# Altium schematic symbol library jlcpcb_2025_04_capacitors_extended_0805.schlib: 3281 symbols (part 11 of 18) (continued)
## CGA0805X5R476M100MT
designator C?  Capacitance: 47uF  (hidden comment: *)
Capacitor, Ceramic (MLCC), 47uF, ±20%, 10V, X5R, ±20%, SMD 0805; Manufacturer: HRE; Manufacturer Part Number: CGA0805X5R476M100MT; Package Size: 0805; JLCPCB Basic Part: No; JLCPCB Part Number: C6119904; Supplier 1: LCSC; Category: Capacitors - MLCC; Supplier Part Number 1: C6119904; Tolerance: ±20%; Voltage Rating: 10V; Temperature Coefficient: X5R; RoHS: Yes; ComponentLink1Description: Datasheet; ComponentLink2Description: JLCPCB Part URL; ComponentLink2URL: https://jlcpcb.com/partdetail/C6119904; ComponentLink3Description: LCSC Part URL; ComponentLink3URL: https://lcsc.com/product-detail/Multilayer-Ceramic-Capacitors-MLCC---SMD-SMT_HRE-HRE-CGA0805X5R476M100MT_C6119904.html
footprint CAP-0805 (0805 (2012M) Capacitor)
pins: 1, 2

## CGA0805X6S226M160MT
designator C?  Capacitance: 22uF  (hidden comment: *)
Capacitor, Ceramic (MLCC), 22uF, ±20%, 16V, X6S, ±20%, SMD 0805; Manufacturer: HRE; Manufacturer Part Number: CGA0805X6S226M160MT; Package Size: 0805; JLCPCB Basic Part: No; JLCPCB Part Number: C6119913; Supplier 1: LCSC; Category: Capacitors - MLCC; Supplier Part Number 1: C6119913; Tolerance: ±20%; Voltage Rating: 16V; Temperature Coefficient: X6S; RoHS: Yes; ComponentLink1Description: Datasheet; ComponentLink2Description: JLCPCB Part URL; ComponentLink2URL: https://jlcpcb.com/partdetail/C6119913; ComponentLink3Description: LCSC Part URL; ComponentLink3URL: https://lcsc.com/product-detail/Multilayer-Ceramic-Capacitors-MLCC---SMD-SMT_HRE-HRE-CGA0805X6S226M160MT_C6119913.html
footprint CAP-0805 (0805 (2012M) Capacitor)
pins: 1, 2

## CGA0805X6S476M6R3MT
designator C?  Capacitance: 47uF  (hidden comment: *)
Capacitor, Ceramic (MLCC), 47uF, ±20%, 6.3V, X6S, ±20%, SMD 0805; Manufacturer: HRE; Manufacturer Part Number: CGA0805X6S476M6R3MT; Package Size: 0805; JLCPCB Basic Part: No; JLCPCB Part Number: C6119922; Supplier 1: LCSC; Category: Capacitors - MLCC; Supplier Part Number 1: C6119922; Tolerance: ±20%; Voltage Rating: 6.3V; Temperature Coefficient: X6S; RoHS: Yes; ComponentLink1Description: Datasheet; ComponentLink2Description: JLCPCB Part URL; ComponentLink2URL: https://jlcpcb.com/partdetail/C6119922; ComponentLink3Description: LCSC Part URL; ComponentLink3URL: https://lcsc.com/product-detail/Multilayer-Ceramic-Capacitors-MLCC---SMD-SMT_HRE-HRE-CGA0805X6S476M6R3MT_C6119922.html
footprint CAP-0805 (0805 (2012M) Capacitor)
pins: 1, 2

## CGA0805X7R106K250MT
designator C?  Capacitance: 10uF  (hidden comment: *)
Capacitor, Ceramic (MLCC), 10uF, ±10%, 25V, X7R, ±10%, SMD 0805; Manufacturer: HRE; Manufacturer Part Number: CGA0805X7R106K250MT; Package Size: 0805; JLCPCB Basic Part: No; JLCPCB Part Number: C6119932; Supplier 1: LCSC; Category: Capacitors - MLCC; Supplier Part Number 1: C6119932; Tolerance: ±10%; Voltage Rating: 25V; Temperature Coefficient: X7R; RoHS: Yes; ComponentLink1Description: Datasheet; ComponentLink2Description: JLCPCB Part URL; ComponentLink2URL: https://jlcpcb.com/partdetail/C6119932; ComponentLink3Description: LCSC Part URL; ComponentLink3URL: https://lcsc.com/product-detail/Multilayer-Ceramic-Capacitors-MLCC---SMD-SMT_HRE-HRE-CGA0805X7R106K250MT_C6119932.html
footprint CAP-0805 (0805 (2012M) Capacitor)
pins: 1, 2

## CGA0805X7R225K101MT
designator C?  Capacitance: 2.2uF  (hidden comment: *)
Capacitor, Ceramic (MLCC), 2.2uF, ±10%, 100V, X7R, ±10%, SMD 0805; Manufacturer: HRE; Manufacturer Part Number: CGA0805X7R225K101MT; Package Size: 0805; JLCPCB Basic Part: No; JLCPCB Part Number: C6119935; Supplier 1: LCSC; Category: Capacitors - MLCC; Supplier Part Number 1: C6119935; Tolerance: ±10%; Voltage Rating: 100V; Temperature Coefficient: X7R; RoHS: Yes; ComponentLink1Description: Datasheet; ComponentLink1URL: https://wmsc.lcsc.com/wmsc/upload/file/pdf/v2/lcsc/2404291513_HRE-CGA0805X7R225K101MT_C6119935.pdf; ComponentLink2Description: JLCPCB Part URL; ComponentLink2URL: https://jlcpcb.com/partdetail/C6119935; ComponentLink3Description: LCSC Part URL; ComponentLink3URL: https://lcsc.com/product-detail/Multilayer-Ceramic-Capacitors-MLCC---SMD-SMT_HRE-HRE-CGA0805X7R225K101MT_C6119935.html
footprint CAP-0805 (0805 (2012M) Capacitor)
pins: 1, 2

## CGA0805X7R475K350MT
designator C?  Capacitance: 4.7uF  (hidden comment: *)
Capacitor, Ceramic (MLCC), 4.7uF, ±10%, 35V, X7R, ±10%, SMD 0805; Manufacturer: HRE; Manufacturer Part Number: CGA0805X7R475K350MT; Package Size: 0805; JLCPCB Basic Part: No; JLCPCB Part Number: C6119943; Supplier 1: LCSC; Category: Capacitors - MLCC; Supplier Part Number 1: C6119943; Tolerance: ±10%; Voltage Rating: 35V; Temperature Coefficient: X7R; RoHS: Yes; ComponentLink1Description: Datasheet; ComponentLink2Description: JLCPCB Part URL; ComponentLink2URL: https://jlcpcb.com/partdetail/C6119943; ComponentLink3Description: LCSC Part URL; ComponentLink3URL: https://lcsc.com/product-detail/Multilayer-Ceramic-Capacitors-MLCC---SMD-SMT_HRE-HRE-CGA0805X7R475K350MT_C6119943.html
footprint CAP-0805 (0805 (2012M) Capacitor)
pins: 1, 2

## CGJ4C2C0G2A101JT000N
designator C?  Capacitance: 100pF  (hidden comment: *)
Capacitor, Ceramic (MLCC), 100pF, ±5%, 100V, C0G, ±5%, SMD 0805; Manufacturer: TDK; Manufacturer Part Number: CGJ4C2C0G2A101JT000N; Package Size: 0805; JLCPCB Basic Part: No; JLCPCB Part Number: C508866; Supplier 1: LCSC; Category: Capacitors - MLCC; Supplier Part Number 1: C508866; Tolerance: ±5%; Voltage Rating: 100V; Temperature Coefficient: C0G; RoHS: Yes; ComponentLink1Description: Datasheet; ComponentLink1URL: https://wmsc.lcsc.com/wmsc/upload/file/pdf/v2/lcsc/2004071033_TDK-CGJ4C2C0G2A101JT000N_C508866.pdf; ComponentLink2Description: JLCPCB Part URL; ComponentLink2URL: https://jlcpcb.com/partdetail/C508866; ComponentLink3Description: LCSC Part URL; ComponentLink3URL: https://lcsc.com/product-detail/Multilayer-Ceramic-Capacitors-MLCC---SMD-SMT_TDK-TDK-CGJ4C2C0G2A101JT000N_C508866.html
footprint CAP-0805 (0805 (2012M) Capacitor)
pins: 1, 2

## CL21A105KACLNNC
designator C?  Capacitance: 1uF  (hidden comment: *)
Capacitor, Ceramic (MLCC), 1uF, ±10%, 25V, X5R, ±10%, SMD 0805; Manufacturer: Samsung Electro-Mechanics; Manufacturer Part Number: CL21A105KACLNNC; Package Size: 0805; JLCPCB Basic Part: No; JLCPCB Part Number: C2932475; Supplier 1: LCSC; Category: Capacitors - MLCC; Supplier Part Number 1: C2932475; Tolerance: ±10%; Voltage Rating: 25V; Temperature Coefficient: X5R; RoHS: Yes; ComponentLink1Description: Datasheet; ComponentLink1URL: https://wmsc.lcsc.com/wmsc/upload/file/pdf/v2/lcsc/2201121530_Samsung-Electro-Mechanics-CL21A105KACLNNC_C2932475.pdf; ComponentLink2Description: JLCPCB Part URL; ComponentLink2URL: https://jlcpcb.com/partdetail/C2932475; ComponentLink3Description: LCSC Part URL; ComponentLink3URL: https://lcsc.com/product-detail/Multilayer-Ceramic-Capacitors-MLCC---SMD-SMT_Samsung-Electro-Mechanics-Samsung-Electro-Mechanics-CL21A105KACLNNC_C2932475.html; ComponentLink4Description: Samsung Component Library; ComponentLink4URL: https://weblib.samsungsem.com/mlcc/mlcc-ec.do?partNumber=CL21A105KACLNN
footprint CAP-0805 (0805 (2012M) Capacitor)
pins: 1, 2

## CL21A105KBCLNNC
designator C?  Capacitance: 1uF  (hidden comment: *)
Capacitor, Ceramic (MLCC), 1uF, ±10%, 50V, X5R, ±10%, SMD 0805; Manufacturer: Samsung Electro-Mechanics; Manufacturer Part Number: CL21A105KBCLNNC; Package Size: 0805; JLCPCB Basic Part: No; JLCPCB Part Number: C318694; Supplier 1: LCSC; Category: Capacitors - MLCC; Supplier Part Number 1: C318694; Tolerance: ±10%; Voltage Rating: 50V; Temperature Coefficient: X5R; RoHS: Yes; ComponentLink1Description: Datasheet; ComponentLink1URL: https://wmsc.lcsc.com/wmsc/upload/file/pdf/v2/lcsc/2304140030_Samsung-Electro-Mechanics-CL21A105KBCLNNC_C318694.pdf; ComponentLink2Description: JLCPCB Part URL; ComponentLink2URL: https://jlcpcb.com/partdetail/C318694; ComponentLink3Description: LCSC Part URL; ComponentLink3URL: https://lcsc.com/product-detail/Multilayer-Ceramic-Capacitors-MLCC---SMD-SMT_Samsung-Electro-Mechanics-Samsung-Electro-Mechanics-CL21A105KBCLNNC_C318694.html; ComponentLink4Description: Samsung Component Library; ComponentLink4URL: https://weblib.samsungsem.com/mlcc/mlcc-ec.do?partNumber=CL21A105KBCLNN
footprint CAP-0805 (0805 (2012M) Capacitor)
pins: 1, 2

## CL21A106KACLRNC
designator C?  Capacitance: 10uF  (hidden comment: *)
Capacitor, Ceramic (MLCC), 10uF, ±10%, 25V, X5R, ±10%, SMD 0805; Manufacturer: Samsung Electro-Mechanics; Manufacturer Part Number: CL21A106KACLRNC; Package Size: 0805; JLCPCB Basic Part: No; JLCPCB Part Number: C318687; Supplier 1: LCSC; Category: Capacitors - MLCC; Supplier Part Number 1: C318687; Tolerance: ±10%; Voltage Rating: 25V; Temperature Coefficient: X5R; RoHS: Yes; ComponentLink1Description: Datasheet; ComponentLink1URL: https://wmsc.lcsc.com/wmsc/upload/file/pdf/v2/lcsc/2304140030_Samsung-Electro-Mechanics-CL21A106KACLRNC_C318687.pdf; ComponentLink2Description: JLCPCB Part URL; ComponentLink2URL: https://jlcpcb.com/partdetail/C318687; ComponentLink3Description: LCSC Part URL; ComponentLink3URL: https://lcsc.com/product-detail/Multilayer-Ceramic-Capacitors-MLCC---SMD-SMT_Samsung-Electro-Mechanics-Samsung-Electro-Mechanics-CL21A106KACLRNC_C318687.html; ComponentLink4Description: Samsung Component Library; ComponentLink4URL: https://weblib.samsungsem.com/mlcc/mlcc-ec.do?partNumber=CL21A106KACLRN
footprint CAP-0805 (0805 (2012M) Capacitor)
pins: 1, 2

## CL21A106KBYQNNE
designator C?  Capacitance: 10uF  (hidden comment: *)
Capacitor, Ceramic (MLCC), 10uF, ±10%, 50V, X5R, ±10%, SMD 0805; Manufacturer: Samsung Electro-Mechanics; Manufacturer Part Number: CL21A106KBYQNNE; Package Size: 0805; JLCPCB Basic Part: No; JLCPCB Part Number: C2932476; Supplier 1: LCSC; Category: Capacitors - MLCC; Supplier Part Number 1: C2932476; Tolerance: ±10%; Voltage Rating: 50V; Temperature Coefficient: X5R; RoHS: Yes; ComponentLink1Description: Datasheet; ComponentLink1URL: https://wmsc.lcsc.com/wmsc/upload/file/pdf/v2/lcsc/2201121530_Samsung-Electro-Mechanics-CL21A106KBYQNNE_C2932476.pdf; ComponentLink2Description: JLCPCB Part URL; ComponentLink2URL: https://jlcpcb.com/partdetail/C2932476; ComponentLink3Description: LCSC Part URL; ComponentLink3URL: https://lcsc.com/product-detail/Multilayer-Ceramic-Capacitors-MLCC---SMD-SMT_Samsung-Electro-Mechanics-Samsung-Electro-Mechanics-CL21A106KBYQNNE_C2932476.html; ComponentLink4Description: Samsung Component Library; ComponentLink4URL: https://weblib.samsungsem.com/mlcc/mlcc-ec.do?partNumber=CL21A106KBYQNN
footprint CAP-0805 (0805 (2012M) Capacitor)
pins: 1, 2

## CL21A106KOCLRNC
designator C?  Capacitance: 10uF  (hidden comment: *)
Capacitor, Ceramic (MLCC), 10uF, ±10%, 16V, X5R, ±10%, SMD 0805; Manufacturer: Samsung Electro-Mechanics; Manufacturer Part Number: CL21A106KOCLRNC; Package Size: 0805; JLCPCB Basic Part: No; JLCPCB Part Number: C318695; Supplier 1: LCSC; Category: Capacitors - MLCC; Supplier Part Number 1: C318695; Tolerance: ±10%; Voltage Rating: 16V; Temperature Coefficient: X5R; RoHS: Yes; ComponentLink1Description: Datasheet; ComponentLink1URL: https://wmsc.lcsc.com/wmsc/upload/file/pdf/v2/lcsc/2304140030_Samsung-Electro-Mechanics-CL21A106KOCLRNC_C318695.pdf; ComponentLink2Description: JLCPCB Part URL; ComponentLink2URL: https://jlcpcb.com/partdetail/C318695; ComponentLink3Description: LCSC Part URL; ComponentLink3URL: https://lcsc.com/product-detail/Multilayer-Ceramic-Capacitors-MLCC---SMD-SMT_Samsung-Electro-Mechanics-Samsung-Electro-Mechanics-CL21A106KOCLRNC_C318695.html; ComponentLink4Description: Samsung Component Library; ComponentLink4URL: https://weblib.samsungsem.com/mlcc/mlcc-ec.do?partNumber=CL21A106KOCLRN
footprint CAP-0805 (0805 (2012M) Capacitor)
pins: 1, 2

## CL21A106KOFNNNE
designator C?  Capacitance: 10uF  (hidden comment: *)
Capacitor, Ceramic (MLCC), 10uF, ±10%, 16V, X5R, ±10%, SMD 0805; Manufacturer: Samsung Electro-Mechanics; Manufacturer Part Number: CL21A106KOFNNNE; Package Size: 0805; JLCPCB Basic Part: No; JLCPCB Part Number: C307518; Supplier 1: LCSC; Category: Capacitors - MLCC; Supplier Part Number 1: C307518; Tolerance: ±10%; Voltage Rating: 16V; Temperature Coefficient: X5R; RoHS: Yes; ComponentLink1Description: Datasheet; ComponentLink1URL: https://wmsc.lcsc.com/wmsc/upload/file/pdf/v2/lcsc/2304140030_Samsung-Electro-Mechanics-CL21A106KOFNNNE_C307518.pdf; ComponentLink2Description: JLCPCB Part URL; ComponentLink2URL: https://jlcpcb.com/partdetail/C307518; ComponentLink3Description: LCSC Part URL; ComponentLink3URL: https://lcsc.com/product-detail/Multilayer-Ceramic-Capacitors-MLCC---SMD-SMT_Samsung-Electro-Mechanics-Samsung-Electro-Mechanics-CL21A106KOFNNNE_C307518.html; ComponentLink4Description: Samsung Component Library; ComponentLink4URL: https://weblib.samsungsem.com/mlcc/mlcc-ec.do?partNumber=CL21A106KOFNNN
footprint CAP-0805 (0805 (2012M) Capacitor)
pins: 1, 2

## CL21A106KOQNNNE
designator C?  Capacitance: 10uF  (hidden comment: *)
Capacitor, Ceramic (MLCC), 10uF, ±10%, 16V, X5R, ±10%, SMD 0805; Manufacturer: Samsung Electro-Mechanics; Manufacturer Part Number: CL21A106KOQNNNE; Package Size: 0805; JLCPCB Basic Part: No; JLCPCB Part Number: C1713; Supplier 1: LCSC; Category: Capacitors - MLCC; Supplier Part Number 1: C1713; Tolerance: ±10%; Voltage Rating: 16V; Temperature Coefficient: X5R; RoHS: Yes; ComponentLink1Description: Datasheet; ComponentLink1URL: https://wmsc.lcsc.com/wmsc/upload/file/pdf/v2/lcsc/2304140030_Samsung-Electro-Mechanics-CL21A106KOQNNNE_C1713.pdf; ComponentLink2Description: JLCPCB Part URL; ComponentLink2URL: https://jlcpcb.com/partdetail/C1713; ComponentLink3Description: LCSC Part URL; ComponentLink3URL: https://lcsc.com/product-detail/Multilayer-Ceramic-Capacitors-MLCC---SMD-SMT_Samsung-Electro-Mechanics-Samsung-Electro-Mechanics-CL21A106KOQNNNE_C1713.html; ComponentLink4Description: Samsung Component Library; ComponentLink4URL: https://weblib.samsungsem.com/mlcc/mlcc-ec.do?partNumber=CL21A106KOQNNN
footprint CAP-0805 (0805 (2012M) Capacitor)
pins: 1, 2

## CL21A106KOQNNNG
designator C?  Capacitance: 10uF  (hidden comment: *)
Capacitor, Ceramic (MLCC), 10uF, ±10%, 16V, X5R, ±10%, SMD 0805; Manufacturer: Samsung Electro-Mechanics; Manufacturer Part Number: CL21A106KOQNNNG; Package Size: 0805; JLCPCB Basic Part: No; JLCPCB Part Number: C307520; Supplier 1: LCSC; Category: Capacitors - MLCC; Supplier Part Number 1: C307520; Tolerance: ±10%; Voltage Rating: 16V; Temperature Coefficient: X5R; RoHS: Yes; ComponentLink1Description: Datasheet; ComponentLink1URL: https://wmsc.lcsc.com/wmsc/upload/file/pdf/v2/lcsc/2304140030_Samsung-Electro-Mechanics-CL21A106KOQNNNG_C307520.pdf; ComponentLink2Description: JLCPCB Part URL; ComponentLink2URL: https://jlcpcb.com/partdetail/C307520; ComponentLink3Description: LCSC Part URL; ComponentLink3URL: https://lcsc.com/product-detail/Multilayer-Ceramic-Capacitors-MLCC---SMD-SMT_Samsung-Electro-Mechanics-Samsung-Electro-Mechanics-CL21A106KOQNNNG_C307520.html; ComponentLink4Description: Samsung Component Library; ComponentLink4URL: https://weblib.samsungsem.com/mlcc/mlcc-ec.do?partNumber=CL21A106KOQNNN
footprint CAP-0805 (0805 (2012M) Capacitor)
pins: 1, 2

## CL21A106KPCLQNC
designator C?  Capacitance: 10uF  (hidden comment: *)
Capacitor, Ceramic (MLCC), 10uF, ±10%, 10V, X5R, ±10%, SMD 0805; Manufacturer: Samsung Electro-Mechanics; Manufacturer Part Number: CL21A106KPCLQNC; Package Size: 0805; JLCPCB Basic Part: No; JLCPCB Part Number: C962097; Supplier 1: LCSC; Category: Capacitors - MLCC; Supplier Part Number 1: C962097; Tolerance: ±10%; Voltage Rating: 10V; Temperature Coefficient: X5R; RoHS: Yes; ComponentLink1Description: Datasheet; ComponentLink1URL: https://wmsc.lcsc.com/wmsc/upload/file/pdf/v2/lcsc/2304140030_Samsung-Electro-Mechanics-CL21A106KPCLQNC_C962097.pdf; ComponentLink2Description: JLCPCB Part URL; ComponentLink2URL: https://jlcpcb.com/partdetail/C962097; ComponentLink3Description: LCSC Part URL; ComponentLink3URL: https://lcsc.com/product-detail/Multilayer-Ceramic-Capacitors-MLCC---SMD-SMT_Samsung-Electro-Mechanics-Samsung-Electro-Mechanics-CL21A106KPCLQNC_C962097.html; ComponentLink4Description: Samsung Component Library; ComponentLink4URL: https://weblib.samsungsem.com/mlcc/mlcc-ec.do?partNumber=CL21A106KPCLQN
footprint CAP-0805 (0805 (2012M) Capacitor)
pins: 1, 2

## CL21A106KPFNNNE
designator C?  Capacitance: 10uF  (hidden comment: *)
Capacitor, Ceramic (MLCC), 10uF, ±10%, 10V, X5R, ±10%, SMD 0805; Manufacturer: Samsung Electro-Mechanics; Manufacturer Part Number: CL21A106KPFNNNE; Package Size: 0805; JLCPCB Basic Part: No; JLCPCB Part Number: C17024; Supplier 1: LCSC; Category: Capacitors - MLCC; Supplier Part Number 1: C17024; Tolerance: ±10%; Voltage Rating: 10V; Temperature Coefficient: X5R; RoHS: Yes; ComponentLink1Description: Datasheet; ComponentLink1URL: https://wmsc.lcsc.com/wmsc/upload/file/pdf/v2/lcsc/2304140030_Samsung-Electro-Mechanics-CL21A106KPFNNNE_C17024.pdf; ComponentLink2Description: JLCPCB Part URL; ComponentLink2URL: https://jlcpcb.com/partdetail/C17024; ComponentLink3Description: LCSC Part URL; ComponentLink3URL: https://lcsc.com/product-detail/Multilayer-Ceramic-Capacitors-MLCC---SMD-SMT_Samsung-Electro-Mechanics-Samsung-Electro-Mechanics-CL21A106KPFNNNE_C17024.html; ComponentLink4Description: Samsung Component Library; ComponentLink4URL: https://weblib.samsungsem.com/mlcc/mlcc-ec.do?partNumber=CL21A106KPFNNN
footprint CAP-0805 (0805 (2012M) Capacitor)
pins: 1, 2

## CL21A106KPFNNNF
designator C?  Capacitance: 10uF  (hidden comment: *)
Capacitor, Ceramic (MLCC), 10uF, ±10%, 10V, X5R, ±10%, SMD 0805; Manufacturer: Samsung Electro-Mechanics; Manufacturer Part Number: CL21A106KPFNNNF; Package Size: 0805; JLCPCB Basic Part: No; JLCPCB Part Number: C307522; Supplier 1: LCSC; Category: Capacitors - MLCC; Supplier Part Number 1: C307522; Tolerance: ±10%; Voltage Rating: 10V; Temperature Coefficient: X5R; RoHS: Yes; ComponentLink1Description: Datasheet; ComponentLink1URL: https://wmsc.lcsc.com/wmsc/upload/file/pdf/v2/lcsc/2304140030_Samsung-Electro-Mechanics-CL21A106KPFNNNF_C307522.pdf; ComponentLink2Description: JLCPCB Part URL; ComponentLink2URL: https://jlcpcb.com/partdetail/C307522; ComponentLink3Description: LCSC Part URL; ComponentLink3URL: https://lcsc.com/product-detail/Multilayer-Ceramic-Capacitors-MLCC---SMD-SMT_Samsung-Electro-Mechanics-Samsung-Electro-Mechanics-CL21A106KPFNNNF_C307522.html; ComponentLink4Description: Samsung Component Library; ComponentLink4URL: https://weblib.samsungsem.com/mlcc/mlcc-ec.do?partNumber=CL21A106KPFNNN
footprint CAP-0805 (0805 (2012M) Capacitor)
pins: 1, 2

## CL21A106KPFNNPE
designator C?  Capacitance: 10uF  (hidden comment: *)
Capacitor, Ceramic (MLCC), 10uF, 10V, X5R, SMD 0805; Manufacturer: Samsung Electro-Mechanics; Manufacturer Part Number: CL21A106KPFNNPE; Package Size: 0805; JLCPCB Basic Part: No; JLCPCB Part Number: C2836790; Supplier 1: LCSC; Category: Capacitors - MLCC; Supplier Part Number 1: C2836790; Voltage Rating: 10V; Temperature Coefficient: X5R; RoHS: Yes; ComponentLink1Description: Datasheet; ComponentLink2Description: JLCPCB Part URL; ComponentLink2URL: https://jlcpcb.com/partdetail/C2836790; ComponentLink3Description: LCSC Part URL; ComponentLink3URL: https://lcsc.com/product-detail/Multilayer-Ceramic-Capacitors-MLCC---SMD-SMT_Samsung-Electro-Mechanics-Samsung-Electro-Mechanics-CL21A106KPFNNPE_C2836790.html; ComponentLink4Description: Samsung Component Library; ComponentLink4URL: https://weblib.samsungsem.com/mlcc/mlcc-ec.do?partNumber=CL21A106KPFNNP
footprint CAP-0805 (0805 (2012M) Capacitor)
pins: 1, 2

## CL21A106KQCLNNC
designator C?  Capacitance: 10uF  (hidden comment: *)
Capacitor, Ceramic (MLCC), 10uF, ±10%, 6.3V, X5R, ±10%, SMD 0805; Manufacturer: Samsung Electro-Mechanics; Manufacturer Part Number: CL21A106KQCLNNC; Package Size: 0805; JLCPCB Basic Part: No; JLCPCB Part Number: C307524; Supplier 1: LCSC; Category: Capacitors - MLCC; Supplier Part Number 1: C307524; Tolerance: ±10%; Voltage Rating: 6.3V; Temperature Coefficient: X5R; RoHS: Yes; ComponentLink1Description: Datasheet; ComponentLink1URL: https://wmsc.lcsc.com/wmsc/upload/file/pdf/v2/lcsc/2304140030_Samsung-Electro-Mechanics-CL21A106KQCLNNC_C307524.pdf; ComponentLink2Description: JLCPCB Part URL; ComponentLink2URL: https://jlcpcb.com/partdetail/C307524; ComponentLink3Description: LCSC Part URL; ComponentLink3URL: https://lcsc.com/product-detail/Multilayer-Ceramic-Capacitors-MLCC---SMD-SMT_Samsung-Electro-Mechanics-Samsung-Electro-Mechanics-CL21A106KQCLNNC_C307524.html; ComponentLink4Description: Samsung Component Library; ComponentLink4URL: https://weblib.samsungsem.com/mlcc/mlcc-ec.do?partNumber=CL21A106KQCLNN
footprint CAP-0805 (0805 (2012M) Capacitor)
pins: 1, 2

## CL21A106KQFNNNE
designator C?  Capacitance: 10uF  (hidden comment: *)
Capacitor, Ceramic (MLCC), 10uF, ±10%, 6.3V, X5R, ±10%, SMD 0805; Manufacturer: Samsung Electro-Mechanics; Manufacturer Part Number: CL21A106KQFNNNE; Package Size: 0805; JLCPCB Basic Part: No; JLCPCB Part Number: C307525; Supplier 1: LCSC; Category: Capacitors - MLCC; Supplier Part Number 1: C307525; Tolerance: ±10%; Voltage Rating: 6.3V; Temperature Coefficient: X5R; RoHS: Yes; ComponentLink1Description: Datasheet; ComponentLink1URL: https://wmsc.lcsc.com/wmsc/upload/file/pdf/v2/lcsc/2304140030_Samsung-Electro-Mechanics-CL21A106KQFNNNE_C307525.pdf; ComponentLink2Description: JLCPCB Part URL; ComponentLink2URL: https://jlcpcb.com/partdetail/C307525; ComponentLink3Description: LCSC Part URL; ComponentLink3URL: https://lcsc.com/product-detail/Multilayer-Ceramic-Capacitors-MLCC---SMD-SMT_Samsung-Electro-Mechanics-Samsung-Electro-Mechanics-CL21A106KQFNNNE_C307525.html; ComponentLink4Description: Samsung Component Library; ComponentLink4URL: https://weblib.samsungsem.com/mlcc/mlcc-ec.do?partNumber=CL21A106KQFNNN
footprint CAP-0805 (0805 (2012M) Capacitor)
pins: 1, 2

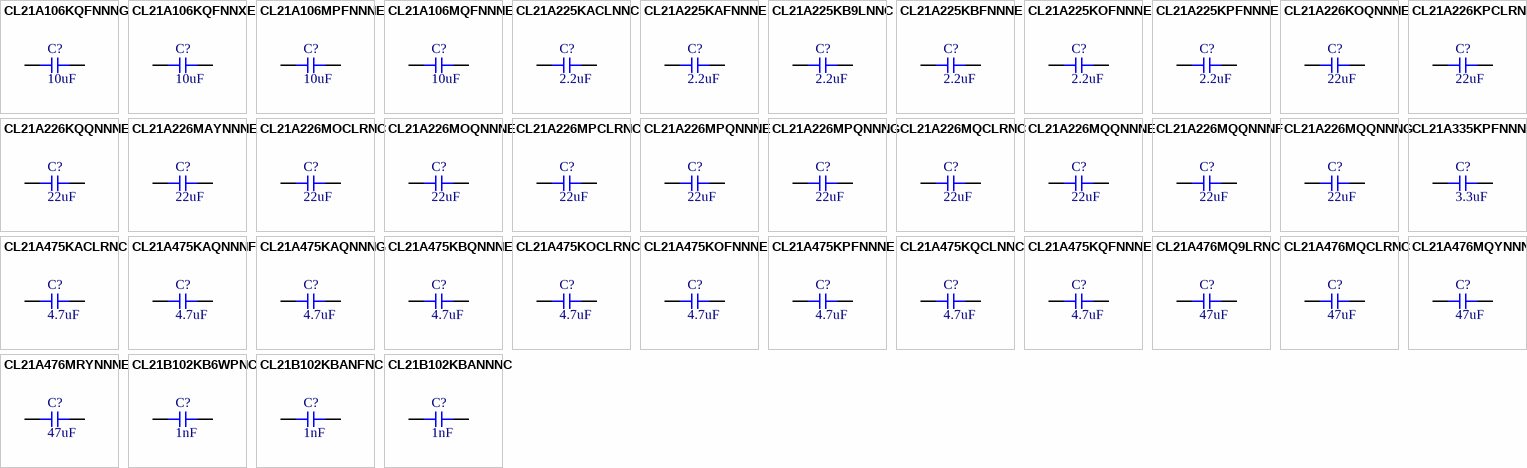
[diagram p49: symbols CL21A106KQFNNNG to CL21B102KBANNNC]

## CL21A106KQFNNNG
designator C?  Capacitance: 10uF  (hidden comment: *)
Capacitor, Ceramic (MLCC), 10uF, ±10%, 6.3V, X5R, ±10%, SMD 0805; Manufacturer: Samsung Electro-Mechanics; Manufacturer Part Number: CL21A106KQFNNNG; Package Size: 0805; JLCPCB Basic Part: No; JLCPCB Part Number: C2762600; Supplier 1: LCSC; Category: Capacitors - MLCC; Supplier Part Number 1: C2762600; Tolerance: ±10%; Voltage Rating: 6.3V; Temperature Coefficient: X5R; RoHS: Yes; ComponentLink1Description: Datasheet; ComponentLink1URL: https://wmsc.lcsc.com/wmsc/upload/file/pdf/v2/lcsc/2304140030_Samsung-Electro-Mechanics-CL21A106KQFNNNG_C2762600.pdf; ComponentLink2Description: JLCPCB Part URL; ComponentLink2URL: https://jlcpcb.com/partdetail/C2762600; ComponentLink3Description: LCSC Part URL; ComponentLink3URL: https://lcsc.com/product-detail/Multilayer-Ceramic-Capacitors-MLCC---SMD-SMT_Samsung-Electro-Mechanics-Samsung-Electro-Mechanics-CL21A106KQFNNNG_C2762600.html; ComponentLink4Description: Samsung Component Library; ComponentLink4URL: https://weblib.samsungsem.com/mlcc/mlcc-ec.do?partNumber=CL21A106KQFNNN
footprint CAP-0805 (0805 (2012M) Capacitor)
pins: 1, 2

## CL21A106KQFNNXE
designator C?  Capacitance: 10uF  (hidden comment: *)
Capacitor, Ceramic (MLCC), 10uF, ±10%, 6.3V, X5R, ±10%, SMD 0805; Manufacturer: Samsung Electro-Mechanics; Manufacturer Part Number: CL21A106KQFNNXE; Package Size: 0805; JLCPCB Basic Part: No; JLCPCB Part Number: C307526; Supplier 1: LCSC; Category: Capacitors - MLCC; Supplier Part Number 1: C307526; Tolerance: ±10%; Voltage Rating: 6.3V; Temperature Coefficient: X5R; RoHS: Yes; ComponentLink1Description: Datasheet; ComponentLink1URL: https://wmsc.lcsc.com/wmsc/upload/file/pdf/v2/lcsc/2304140030_Samsung-Electro-Mechanics-CL21A106KQFNNXE_C307526.pdf; ComponentLink2Description: JLCPCB Part URL; ComponentLink2URL: https://jlcpcb.com/partdetail/C307526; ComponentLink3Description: LCSC Part URL; ComponentLink3URL: https://lcsc.com/product-detail/Multilayer-Ceramic-Capacitors-MLCC---SMD-SMT_Samsung-Electro-Mechanics-Samsung-Electro-Mechanics-CL21A106KQFNNXE_C307526.html; ComponentLink4Description: Samsung Component Library; ComponentLink4URL: https://weblib.samsungsem.com/mlcc/mlcc-ec.do?partNumber=CL21A106KQFNNX
footprint CAP-0805 (0805 (2012M) Capacitor)
pins: 1, 2

## CL21A106MPFNNNE
designator C?  Capacitance: 10uF  (hidden comment: *)
Capacitor, Ceramic (MLCC), 10uF, ±20%, 10V, X5R, ±20%, SMD 0805; Manufacturer: Samsung Electro-Mechanics; Manufacturer Part Number: CL21A106MPFNNNE; Package Size: 0805; JLCPCB Basic Part: No; JLCPCB Part Number: C91245; Supplier 1: LCSC; Category: Capacitors - MLCC; Supplier Part Number 1: C91245; Tolerance: ±20%; Voltage Rating: 10V; Temperature Coefficient: X5R; RoHS: Yes; ComponentLink1Description: Datasheet; ComponentLink1URL: https://wmsc.lcsc.com/wmsc/upload/file/pdf/v2/lcsc/1811021410_Samsung-Electro-Mechanics-CL21A106MPFNNNE_C91245.pdf; ComponentLink2Description: JLCPCB Part URL; ComponentLink2URL: https://jlcpcb.com/partdetail/C91245; ComponentLink3Description: LCSC Part URL; ComponentLink3URL: https://lcsc.com/product-detail/Multilayer-Ceramic-Capacitors-MLCC---SMD-SMT_Samsung-Electro-Mechanics-Samsung-Electro-Mechanics-CL21A106MPFNNNE_C91245.html; ComponentLink4Description: Samsung Component Library; ComponentLink4URL: https://weblib.samsungsem.com/mlcc/mlcc-ec.do?partNumber=CL21A106MPFNNN
footprint CAP-0805 (0805 (2012M) Capacitor)
pins: 1, 2

## CL21A106MQFNNNE
designator C?  Capacitance: 10uF  (hidden comment: *)
Capacitor, Ceramic (MLCC), 10uF, ±20%, 6.3V, X5R, ±20%, SMD 0805; Manufacturer: Samsung Electro-Mechanics; Manufacturer Part Number: CL21A106MQFNNNE; Package Size: 0805; JLCPCB Basic Part: No; JLCPCB Part Number: C41893; Supplier 1: LCSC; Category: Capacitors - MLCC; Supplier Part Number 1: C41893; Tolerance: ±20%; Voltage Rating: 6.3V; Temperature Coefficient: X5R; RoHS: Yes; ComponentLink1Description: Datasheet; ComponentLink1URL: https://wmsc.lcsc.com/wmsc/upload/file/pdf/v2/lcsc/2304140030_Samsung-Electro-Mechanics-CL21A106MQFNNNE_C41893.pdf; ComponentLink2Description: JLCPCB Part URL; ComponentLink2URL: https://jlcpcb.com/partdetail/C41893; ComponentLink3Description: LCSC Part URL; ComponentLink3URL: https://lcsc.com/product-detail/Multilayer-Ceramic-Capacitors-MLCC---SMD-SMT_Samsung-Electro-Mechanics-Samsung-Electro-Mechanics-CL21A106MQFNNNE_C41893.html; ComponentLink4Description: Samsung Component Library; ComponentLink4URL: https://weblib.samsungsem.com/mlcc/mlcc-ec.do?partNumber=CL21A106MQFNNN
footprint CAP-0805 (0805 (2012M) Capacitor)
pins: 1, 2

## CL21A225KACLNNC
designator C?  Capacitance: 2.2uF  (hidden comment: *)
Capacitor, Ceramic (MLCC), 2.2uF, ±10%, 25V, X5R, ±10%, SMD 0805; Manufacturer: Samsung Electro-Mechanics; Manufacturer Part Number: CL21A225KACLNNC; Package Size: 0805; JLCPCB Basic Part: No; JLCPCB Part Number: C318705; Supplier 1: LCSC; Category: Capacitors - MLCC; Supplier Part Number 1: C318705; Tolerance: ±10%; Voltage Rating: 25V; Temperature Coefficient: X5R; RoHS: Yes; ComponentLink1Description: Datasheet; ComponentLink1URL: https://wmsc.lcsc.com/wmsc/upload/file/pdf/v2/lcsc/2304140030_Samsung-Electro-Mechanics-CL21A225KACLNNC_C318705.pdf; ComponentLink2Description: JLCPCB Part URL; ComponentLink2URL: https://jlcpcb.com/partdetail/C318705; ComponentLink3Description: LCSC Part URL; ComponentLink3URL: https://lcsc.com/product-detail/Multilayer-Ceramic-Capacitors-MLCC---SMD-SMT_Samsung-Electro-Mechanics-Samsung-Electro-Mechanics-CL21A225KACLNNC_C318705.html; ComponentLink4Description: Samsung Component Library; ComponentLink4URL: https://weblib.samsungsem.com/mlcc/mlcc-ec.do?partNumber=CL21A225KACLNN
footprint CAP-0805 (0805 (2012M) Capacitor)
pins: 1, 2

## CL21A225KAFNNNE
designator C?  Capacitance: 2.2uF  (hidden comment: *)
Capacitor, Ceramic (MLCC), 2.2uF, ±10%, 25V, X5R, ±10%, SMD 0805; Manufacturer: Samsung Electro-Mechanics; Manufacturer Part Number: CL21A225KAFNNNE; Package Size: 0805; JLCPCB Basic Part: No; JLCPCB Part Number: C87994; Supplier 1: LCSC; Category: Capacitors - MLCC; Supplier Part Number 1: C87994; Tolerance: ±10%; Voltage Rating: 25V; Temperature Coefficient: X5R; RoHS: Yes; ComponentLink1Description: Datasheet; ComponentLink1URL: https://wmsc.lcsc.com/wmsc/upload/file/pdf/v2/lcsc/1811151223_Samsung-Electro-Mechanics-CL21A225KAFNNNE_C87994.pdf; ComponentLink2Description: JLCPCB Part URL; ComponentLink2URL: https://jlcpcb.com/partdetail/C87994; ComponentLink3Description: LCSC Part URL; ComponentLink3URL: https://lcsc.com/product-detail/Multilayer-Ceramic-Capacitors-MLCC---SMD-SMT_Samsung-Electro-Mechanics-Samsung-Electro-Mechanics-CL21A225KAFNNNE_C87994.html; ComponentLink4Description: Samsung Component Library; ComponentLink4URL: https://weblib.samsungsem.com/mlcc/mlcc-ec.do?partNumber=CL21A225KAFNNN
footprint CAP-0805 (0805 (2012M) Capacitor)
pins: 1, 2

## CL21A225KB9LNNC
designator C?  Capacitance: 2.2uF  (hidden comment: *)
Capacitor, Ceramic (MLCC), 2.2uF, ±10%, 50V, X5R, ±10%, SMD 0805; Manufacturer: Samsung Electro-Mechanics; Manufacturer Part Number: CL21A225KB9LNNC; Package Size: 0805; JLCPCB Basic Part: No; JLCPCB Part Number: C159782; Supplier 1: LCSC; Category: Capacitors - MLCC; Supplier Part Number 1: C159782; Tolerance: ±10%; Voltage Rating: 50V; Temperature Coefficient: X5R; RoHS: Yes; ComponentLink1Description: Datasheet; ComponentLink1URL: https://wmsc.lcsc.com/wmsc/upload/file/pdf/v2/lcsc/2304140030_Samsung-Electro-Mechanics-CL21A225KB9LNNC_C159782.pdf; ComponentLink2Description: JLCPCB Part URL; ComponentLink2URL: https://jlcpcb.com/partdetail/C159782; ComponentLink3Description: LCSC Part URL; ComponentLink3URL: https://lcsc.com/product-detail/Multilayer-Ceramic-Capacitors-MLCC---SMD-SMT_Samsung-Electro-Mechanics-Samsung-Electro-Mechanics-CL21A225KB9LNNC_C159782.html; ComponentLink4Description: Samsung Component Library; ComponentLink4URL: https://weblib.samsungsem.com/mlcc/mlcc-ec.do?partNumber=CL21A225KB9LNN
footprint CAP-0805 (0805 (2012M) Capacitor)
pins: 1, 2

## CL21A225KBFNNNE
designator C?  Capacitance: 2.2uF  (hidden comment: *)
Capacitor, Ceramic (MLCC), 2.2uF, ±10%, 50V, X5R, ±10%, SMD 0805; Manufacturer: Samsung Electro-Mechanics; Manufacturer Part Number: CL21A225KBFNNNE; Package Size: 0805; JLCPCB Basic Part: No; JLCPCB Part Number: C307528; Supplier 1: LCSC; Category: Capacitors - MLCC; Supplier Part Number 1: C307528; Tolerance: ±10%; Voltage Rating: 50V; Temperature Coefficient: X5R; RoHS: Yes; ComponentLink1Description: Datasheet; ComponentLink1URL: https://wmsc.lcsc.com/wmsc/upload/file/pdf/v2/lcsc/2304140030_Samsung-Electro-Mechanics-CL21A225KBFNNNE_C307528.pdf; ComponentLink2Description: JLCPCB Part URL; ComponentLink2URL: https://jlcpcb.com/partdetail/C307528; ComponentLink3Description: LCSC Part URL; ComponentLink3URL: https://lcsc.com/product-detail/Multilayer-Ceramic-Capacitors-MLCC---SMD-SMT_Samsung-Electro-Mechanics-Samsung-Electro-Mechanics-CL21A225KBFNNNE_C307528.html; ComponentLink4Description: Samsung Component Library; ComponentLink4URL: https://weblib.samsungsem.com/mlcc/mlcc-ec.do?partNumber=CL21A225KBFNNN
footprint CAP-0805 (0805 (2012M) Capacitor)
pins: 1, 2

## CL21A225KOFNNNE
designator C?  Capacitance: 2.2uF  (hidden comment: *)
Capacitor, Ceramic (MLCC), 2.2uF, ±10%, 16V, X5R, ±10%, SMD 0805; Manufacturer: Samsung Electro-Mechanics; Manufacturer Part Number: CL21A225KOFNNNE; Package Size: 0805; JLCPCB Basic Part: No; JLCPCB Part Number: C1731; Supplier 1: LCSC; Category: Capacitors - MLCC; Supplier Part Number 1: C1731; Tolerance: ±10%; Voltage Rating: 16V; Temperature Coefficient: X5R; RoHS: Yes; ComponentLink1Description: Datasheet; ComponentLink1URL: https://wmsc.lcsc.com/wmsc/upload/file/pdf/v2/lcsc/2304140030_Samsung-Electro-Mechanics-CL21A225KOFNNNE_C1731.pdf; ComponentLink2Description: JLCPCB Part URL; ComponentLink2URL: https://jlcpcb.com/partdetail/C1731; ComponentLink3Description: LCSC Part URL; ComponentLink3URL: https://lcsc.com/product-detail/Multilayer-Ceramic-Capacitors-MLCC---SMD-SMT_Samsung-Electro-Mechanics-Samsung-Electro-Mechanics-CL21A225KOFNNNE_C1731.html; ComponentLink4Description: Samsung Component Library; ComponentLink4URL: https://weblib.samsungsem.com/mlcc/mlcc-ec.do?partNumber=CL21A225KOFNNN
footprint CAP-0805 (0805 (2012M) Capacitor)
pins: 1, 2

## CL21A225KPFNNNE
designator C?  Capacitance: 2.2uF  (hidden comment: *)
Capacitor, Ceramic (MLCC), 2.2uF, ±10%, 10V, X5R, ±10%, SMD 0805; Manufacturer: Samsung Electro-Mechanics; Manufacturer Part Number: CL21A225KPFNNNE; Package Size: 0805; JLCPCB Basic Part: No; JLCPCB Part Number: C84716; Supplier 1: LCSC; Category: Capacitors - MLCC; Supplier Part Number 1: C84716; Tolerance: ±10%; Voltage Rating: 10V; Temperature Coefficient: X5R; RoHS: Yes; ComponentLink1Description: Datasheet; ComponentLink1URL: https://wmsc.lcsc.com/wmsc/upload/file/pdf/v2/lcsc/2304140030_Samsung-Electro-Mechanics-CL21A225KPFNNNE_C84716.pdf; ComponentLink2Description: JLCPCB Part URL; ComponentLink2URL: https://jlcpcb.com/partdetail/C84716; ComponentLink3Description: LCSC Part URL; ComponentLink3URL: https://lcsc.com/product-detail/Multilayer-Ceramic-Capacitors-MLCC---SMD-SMT_Samsung-Electro-Mechanics-Samsung-Electro-Mechanics-CL21A225KPFNNNE_C84716.html; ComponentLink4Description: Samsung Component Library; ComponentLink4URL: https://weblib.samsungsem.com/mlcc/mlcc-ec.do?partNumber=CL21A225KPFNNN
footprint CAP-0805 (0805 (2012M) Capacitor)
pins: 1, 2

## CL21A226KOQNNNE
designator C?  Capacitance: 22uF  (hidden comment: *)
Capacitor, Ceramic (MLCC), 22uF, ±10%, 16V, X5R, ±10%, SMD 0805; Manufacturer: Samsung Electro-Mechanics; Manufacturer Part Number: CL21A226KOQNNNE; Package Size: 0805; JLCPCB Basic Part: No; JLCPCB Part Number: C296720; Supplier 1: LCSC; Category: Capacitors - MLCC; Supplier Part Number 1: C296720; Tolerance: ±10%; Voltage Rating: 16V; Temperature Coefficient: X5R; RoHS: Yes; ComponentLink1Description: Datasheet; ComponentLink1URL: https://wmsc.lcsc.com/wmsc/upload/file/pdf/v2/lcsc/2304140030_Samsung-Electro-Mechanics-CL21A226KOQNNNE_C296720.pdf; ComponentLink2Description: JLCPCB Part URL; ComponentLink2URL: https://jlcpcb.com/partdetail/C296720; ComponentLink3Description: LCSC Part URL; ComponentLink3URL: https://lcsc.com/product-detail/Multilayer-Ceramic-Capacitors-MLCC---SMD-SMT_Samsung-Electro-Mechanics-Samsung-Electro-Mechanics-CL21A226KOQNNNE_C296720.html; ComponentLink4Description: Samsung Component Library; ComponentLink4URL: https://weblib.samsungsem.com/mlcc/mlcc-ec.do?partNumber=CL21A226KOQNNN
footprint CAP-0805 (0805 (2012M) Capacitor)
pins: 1, 2
